# Altium footprint library MYLIB.PcbLib: 600 footprints (part 23 of 39)
Each footprint in its own frame and in the unit in brackets; x right, y up, seen from the top. Pads: shape width x height; smd on the part's side, far side on the other; paste and mask are expansions set on the pad; w line width, h text height; cw(c..) or ccw(c..) is an arc to the next point about the centre after c.
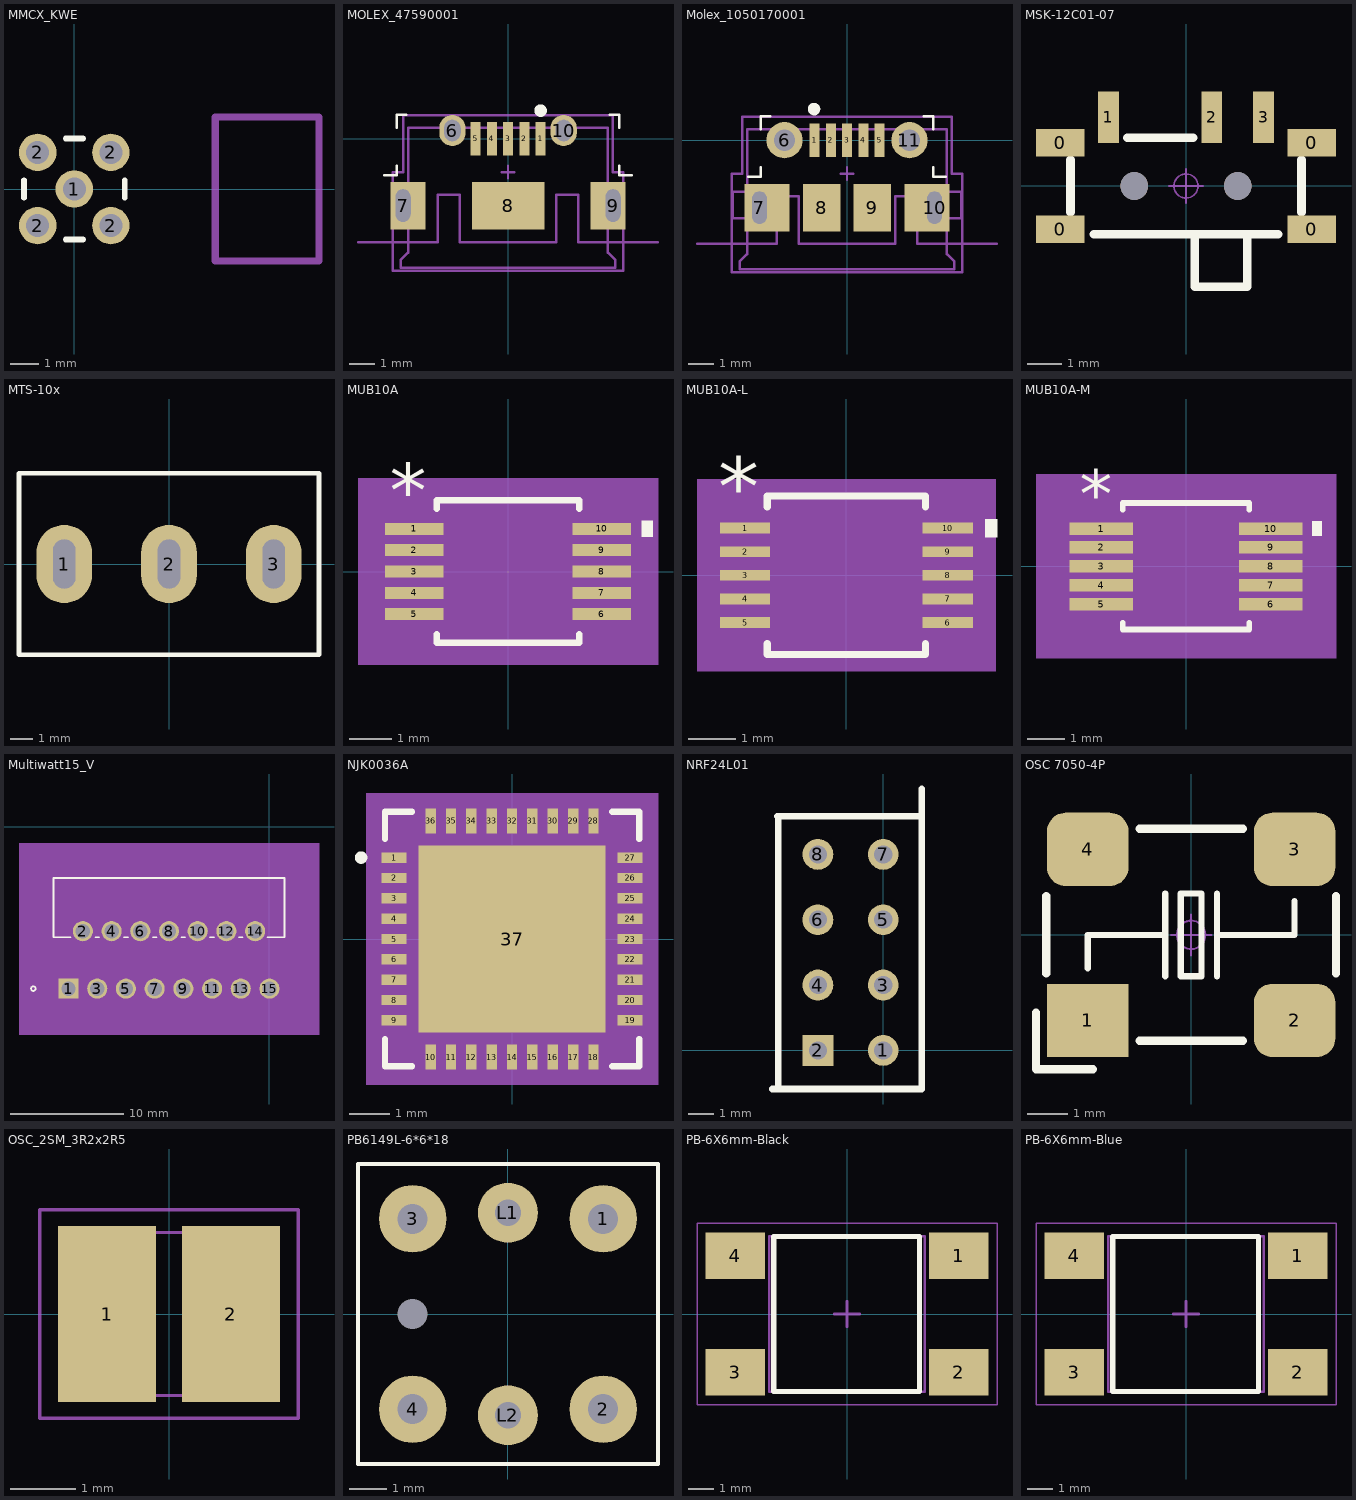
[diagram p22: the footprints below, top view; thin cyan lines are the x and y axes]

## MMCX_KWE [mm]
pads (5):
  round 1.3 hole 0.8: 1(0,0) 2(-1.27,-1.27) 2(-1.27,1.27) 2(1.27,-1.27) 2(1.27,1.27)
Top Overlay:
  lines w0.2: -1.75,-0.3 -1.75,0.3 ; -0.3,-1.75 0.3,-1.75 ; -0.3,1.75 0.3,1.75 ; 1.75,-0.3 1.75,0.3
Mechanical 13:
  lines w0.254: 4.9,-2.5 4.9,2.5 8.5,2.5 8.5,-2.5 4.9,-2.5
3D body: height 3.85, standoff 0, extent -1.75,-1.75 1.75,1.75
3D body: height 3.67, standoff 0.18, extent 1.75,-1.75 4.89,1.75
3D body: height 0, standoff -3, extent -1.52,1.02 -1.02,1.52
3D body: height 0, standoff -3, extent -0.25,-0.25 0.25,0.25
3D body: height 0, standoff -3, extent 1.02,1.02 1.52,1.52
3D body: height 0, standoff -3, extent -1.52,-1.52 -1.02,-1.02
3D body: height 0, standoff -3, extent 1.02,-1.52 1.52,-1.02

## MOLEX_47590001 [mm] "USB Micro-B Connector"
height 2.667
pads (10):
  rect 0.4x1.35 smd: 1(1.3,0) 2(0.65,0) 3(0,0) 4(-0.65,0) 5(-1.3,0)
  oval 1.05x1.25 hole 0.65 slot 0.85 at 90 deg: 6(-2.225,0.325) 10(2.225,0.325)
  rect 1.4x1.9 hole 0.6 slot 1.3 at 90 deg copper offset 0.2,0: 7(-4.2,-2.675)
  rect 2.9x1.9 smd: 8(0,-2.675)
  rect 1.4x1.9 hole 0.6 slot 1.3 at 90 deg copper offset -0.2,0: 9(4.2,-2.675)
Top Overlay:
  circle w0.25: c1.304,1.122 r0.125
  lines w0.1: -4.953,-1.465 -4.445,-1.465 -4.445,-1.084 ; -4.445,0.44 -4.445,0.948 -4.064,0.948 ; 4.064,0.948 4.445,0.948 4.445,0.44 ; 4.445,-1.084 4.445,-1.465 4.953,-1.465
Mechanical 1:
  lines w0.1: -6,-4.137 -2.82,-4.137 -2.82,-2.238 -1.92,-2.238 -1.92,-4.137 0,-4.137 1.92,-4.137 1.92,-2.238 2.82,-2.238 2.82,-4.137 6,-4.137
  text "Board edge" at 5.588,-4.005 h0.2
Mechanical 13:
  lines w0.1: -4,0.442 -4,-2.058 -4.572,-2.058 -4.572,-3.116 -4,-3.116 -4,-4.558 -4.3,-4.858 -4.3,-5.158 4.3,-5.158 4.3,-4.858 4,-4.558 4,-3.116 4.572,-3.116 4.572,-2.058 4,-2.058 4,0.442 ; -4,0.442 4,0.442 ; -4,0.442 4,0.442
Mechanical 15:
  lines w0.1: -4.2,0.937 4.2,0.937 ; -4.2,0.94 -4.2,-1.338 -4.6,-1.338 -4.6,-4.137 -4.6,-5.275 4.6,-5.275 4.6,-4.137 4.6,-1.338 4.2,-1.338 4.2,0.94 ; -0.254,-1.338 0.254,-1.338 ; 0,-1.592 0,-1.084
3D body "ZX62R-B-5P.stp": height 2.71, standoff -0.23, extent -4.4,-5.291 4.4,0.44

## Molex_1050170001 [mm] "USB Micro-B Connector"
height 2.667
pads (11):
  rect 0.4x1.35 smd: 1(-1.3,0) 2(-0.65,0) 3(0,0) 4(0.65,0) 5(1.3,0)
  round 1.45 hole 0.85: 6(-2.5,0) 11(2.5,0)
  rect 1.8x1.9 hole 0.6 slot 1.3 at 90 deg copper offset 0.3,0: 7(-3.5,-2.7)
  rect 1.5x1.9 smd: 8(-1,-2.7) 9(1,-2.7)
  rect 1.8x1.9 hole 0.6 slot 1.3 at 90 deg copper offset -0.3,0: 10(3.5,-2.7)
Top Overlay:
  circle w0.25: c-1.319,1.245 r0.125
  lines w0.1: -3.953,-1.465 -3.445,-1.465 -3.445,-1.084 ; -3.445,0.44 -3.445,0.948 -3.064,0.948 ; 3.064,0.948 3.445,0.948 3.445,0.44 ; 3.445,-1.084 3.445,-1.465 3.953,-1.465
Mechanical 1:
  lines w0.1: -6,-4.137 -2.82,-4.137 -2.82,-2.238 -1.92,-2.238 -1.92,-4.137 0,-4.137 1.92,-4.137 1.92,-2.238 2.82,-2.238 2.82,-4.137 6,-4.137
  text "Board edge" at 5.588,-4.005 h0.2
Mechanical 13:
  lines w0.1: -4,0.442 -4,-2.058 -4.572,-2.058 -4.572,-3.116 -4,-3.116 -4,-4.558 -4.3,-4.858 -4.3,-5.158 4.3,-5.158 4.3,-4.858 4,-4.558 4,-3.116 4.572,-3.116 4.572,-2.058 4,-2.058 4,0.442 ; -4,0.442 4,0.442 ; -4,0.442 4,0.442
Mechanical 15:
  lines w0.1: -4.2,0.937 4.2,0.937 ; -4.2,0.94 -4.2,-1.338 -4.6,-1.338 -4.6,-4.137 -4.6,-5.275 4.6,-5.275 4.6,-4.137 4.6,-1.338 4.2,-1.338 4.2,0.94 ; -0.254,-1.338 0.254,-1.338 ; 0,-1.592 0,-1.084
3D body "1050170001.stp": height 2.58, standoff -0.72, extent -4.1,-5.207 4.1,0.193

## MSK-12C01-07 [mm] "6.7*2.8*1.5mm(长宽高）"
pads (9):
  rect 1.4x0.8 smd: 0(-3.65,-1.25) 0(-3.65,1.25) 0(3.65,-1.25) 0(3.65,1.25)
  rect 0.6x1.5 smd: 1(-2.25,1.996) 2(0.75,1.996) 3(2.25,1.996)
  round 0.8 hole 0.8: " "(-1.5,0) " "(1.5,0)
Top Overlay:
  lines w0.254: -3.35,-0.762 -3.35,0.762 ; -2.667,-1.397 2.667,-1.397 ; -1.699,1.397 0.206,1.397 ; 0.254,-1.4 0.254,-2.921 1.778,-2.921 1.778,-1.4 ; 3.35,-0.762 3.35,0.762
Mechanical 15:
  circle w0.05: c0,0 r0.35
  lines w0.05: -0.5,0 0.5,0 ; 0,-0.5 0,0.5
3D body "MSK-12C01-07.STEP": height 1.5, standoff -0.5, extent -3.92,-2.9 3.92,2.4

## MTS-10x [mm] "MTS10系列3脚扭子开关"
pads (3):
  oval 2.5x3.5 hole 1 slot 2.2 at 90 deg unplated: 1(-4.7,0) 2(0,0) 3(4.7,0)
Top Overlay:
  lines w0.203: -6.731,-4.064 -6.731,4.064 6.731,4.064 6.731,-4.064 -6.731,-4.064
3D body "MTS-102.STEP": height 30.47, standoff -2.95, extent -6.6,-3.95 6.6,3.95

## MUB10A [mil]
pads (10):
  rect 54x11 smd: 1(-86.5,39.37) 2(-86.5,19.68) 3(-86.5,0) 4(-86.5,-19.68) 5(-86.5,-39.37) 6(86.5,-39.37) 7(86.5,-19.68) 8(86.5,0) 9(86.5,19.68) 10(86.5,39.37)
Top Overlay:
  region: 123.5,46.87 133.5,46.87 133.5,31.87 123.5,31.87
  lines w6: -66,-57.97 -66,-66 66,-66 66,-57.97 ; -66,57.97 -66,66 66,66 66,57.97
  text "*" at -109,49.87 h50
Mechanical 5:
  region: 138.5,-86 -138.5,-86 -138.5,86 138.5,86
Mechanical 13:
  lines w0: -12,61 ccw(c0,61) 12,61
  lines w1: -99.5,-45.87 -99.5,-32.87 -61,-32.87 -61,-45.87 -99.5,-45.87 ; -99.5,-26.18 -99.5,-13.19 -61,-13.19 -61,-26.18 -99.5,-26.18 ; -99.5,-6.5 -99.5,6.5 -61,6.5 -61,-6.5 -99.5,-6.5 ; -99.5,13.19 -99.5,26.18 -61,26.18 -61,13.19 -99.5,13.19 ; -99.5,32.87 -99.5,45.87 -61,45.87 -61,32.87 -99.5,32.87 ; -61,-61 61,-61 61,61 -61,61 -61,-61 ; 61,-45.87 61,-32.87 99.5,-32.87 99.5,-45.87 61,-45.87 ; 61,-26.18 61,-13.19 99.5,-13.19 99.5,-26.18 61,-26.18 ; 61,-6.5 61,6.5 99.5,6.5 99.5,-6.5 61,-6.5 ; 61,13.19 61,26.18 99.5,26.18 99.5,13.19 61,13.19 ; 61,32.87 61,45.87 99.5,45.87 99.5,32.87 61,32.87
  text "*" at -63.5,24.87 h50
Mechanical 15:
  region: -71,-51.21 -123.5,-51.21 -123.5,51.21 -71,51.21 -71,71 71,71 71,51.21 123.5,51.21 123.5,-51.21 71,-51.21 71,-71 -71,-71
  lines w6: -123.5,-51.21 -123.5,51.21 -71,51.21 -71,71 71,71 71,51.21 123.5,51.21 123.5,-51.21 71,-51.21 71,-71 -71,-71 -71,-51.21 -123.5,-51.21
3D body: height 10, standoff 0, extent 0,0 10,10

## MUB10A-L [mil]
pads (10):
  rect 42x9 smd: 1(-84.5,39.37) 2(-84.5,19.68) 3(-84.5,0) 4(-84.5,-19.68) 5(-84.5,-39.37) 6(84.5,-39.37) 7(84.5,-19.68) 8(84.5,0) 9(84.5,19.68) 10(84.5,39.37)
Top Overlay:
  region: 115.5,46.87 125.5,46.87 125.5,31.87 115.5,31.87
  lines w6: -66,-56.97 -66,-66 66,-66 66,-56.97 ; -66,56.97 -66,66 66,66 66,56.97
  text "*" at -107,48.87 h50
Mechanical 5:
  region: 124.5,-80 -124.5,-80 -124.5,80 124.5,80
Mechanical 13:
  lines w0: -12,61 ccw(c0,61) 12,61
  lines w1: -99.5,-45.87 -61,-45.87 -61,-32.87 -99.5,-32.87 -99.5,-45.87 ; -99.5,-26.18 -61,-26.18 -61,-13.19 -99.5,-13.19 -99.5,-26.18 ; -99.5,-6.5 -61,-6.5 -61,6.5 -99.5,6.5 -99.5,-6.5 ; -99.5,13.19 -61,13.19 -61,26.18 -99.5,26.18 -99.5,13.19 ; -99.5,32.87 -61,32.87 -61,45.87 -99.5,45.87 -99.5,32.87 ; -61,-61 -61,61 61,61 61,-61 -61,-61 ; 61,-45.87 99.5,-45.87 99.5,-32.87 61,-32.87 61,-45.87 ; 61,-26.18 99.5,-26.18 99.5,-13.19 61,-13.19 61,-26.18 ; 61,-6.5 99.5,-6.5 99.5,6.5 61,6.5 61,-6.5 ; 61,13.19 99.5,13.19 99.5,26.18 61,26.18 61,13.19 ; 61,32.87 99.5,32.87 99.5,45.87 61,45.87 61,32.87
  text "*" at -63.5,23.87 h50
Mechanical 15:
  region: -65,-50.01 -109.5,-50.01 -109.5,50.01 -65,50.01 -65,65 65,65 65,50.01 109.5,50.01 109.5,-50.01 65,-50.01 65,-65 -65,-65
  lines w6: -109.5,-50.01 -65,-50.01 -65,-65 65,-65 65,-50.01 109.5,-50.01 109.5,50.01 65,50.01 65,65 -65,65 -65,50.01 -109.5,50.01 -109.5,-50.01
3D body: height 10, standoff 0, extent 0,0 10,10

## MUB10A-M [mil]
pads (10):
  rect 66x13 smd: 1(-88.5,39.37) 2(-88.5,19.68) 3(-88.5,0) 4(-88.5,-19.68) 5(-88.5,-39.37) 6(88.5,-39.37) 7(88.5,-19.68) 8(88.5,0) 9(88.5,19.68) 10(88.5,39.37)
Top Overlay:
  region: 131.5,46.87 141.5,46.87 141.5,31.87 131.5,31.87
  lines w6: -66,-58.97 -66,-66 66,-66 66,-58.97 ; -66,58.97 -66,66 66,66 66,58.97
  text "*" at -111,50.87 h50
Mechanical 5:
  region: 156.5,-96 -156.5,-96 -156.5,96 156.5,96
Mechanical 13:
  lines w0: -12,61 ccw(c0,61) 12,61
  lines w1: -99.5,-45.87 -99.5,-32.87 -61,-32.87 -61,-45.87 -99.5,-45.87 ; -99.5,-26.18 -99.5,-13.19 -61,-13.19 -61,-26.18 -99.5,-26.18 ; -99.5,-6.5 -99.5,6.5 -61,6.5 -61,-6.5 -99.5,-6.5 ; -99.5,13.19 -99.5,26.18 -61,26.18 -61,13.19 -99.5,13.19 ; -99.5,32.87 -99.5,45.87 -61,45.87 -61,32.87 -99.5,32.87 ; -61,-61 61,-61 61,61 -61,61 -61,-61 ; 61,-45.87 61,-32.87 99.5,-32.87 99.5,-45.87 61,-45.87 ; 61,-26.18 61,-13.19 99.5,-13.19 99.5,-26.18 61,-26.18 ; 61,-6.5 61,6.5 99.5,6.5 99.5,-6.5 61,-6.5 ; 61,13.19 61,26.18 99.5,26.18 99.5,13.19 61,13.19 ; 61,32.87 61,45.87 99.5,45.87 99.5,32.87 61,32.87
  text "*" at -63.5,25.87 h50
Mechanical 15:
  region: -81,-53.21 -141.5,-53.21 -141.5,53.21 -81,53.21 -81,81 81,81 81,53.21 141.5,53.21 141.5,-53.21 81,-53.21 81,-81 -81,-81
  lines w6: -141.5,-53.21 -141.5,53.21 -81,53.21 -81,81 81,81 81,53.21 141.5,53.21 141.5,-53.21 81,-53.21 81,-81 -81,-81 -81,-53.21 -141.5,-53.21
3D body: height 10, standoff 0, extent 0,0 10,10

## Multiwatt15_V [mil]
pads (15):
  rect 70x70 hole 50: 1(-700,-564.42)
  round 70 hole 50: 2(-650,-364.42) 3(-600,-564.42) 4(-550,-364.42) 5(-500,-564.42) 6(-450,-364.42) 7(-400,-564.42) 8(-350,-364.42) 9(-300,-564.42) 10(-250,-364.42) 11(-200,-564.42) 12(-150,-364.42) 13(-100,-564.42) 14(-50,-364.42) 15(0,-564.42)
Top Overlay:
  circle w6: c-822.5,-564.42 r8
  lines w6: -693.13,-385.71 -752.5,-385.71 -752.5,-178.71 52.5,-178.71 52.5,-385.71 -6.87,-385.71 ; -606.87,-385.71 -593.13,-385.71 ; -506.87,-385.71 -493.13,-385.71 ; -406.87,-385.71 -393.13,-385.71 ; -306.87,-385.71 -293.13,-385.71 ; -206.87,-385.71 -193.13,-385.71 ; -106.87,-385.71 -93.13,-385.71
Mechanical 5:
  region: -872.5,-58.71 172.5,-58.71 172.5,-724.42 -872.5,-724.42
Mechanical 13:
  circle w0: c-737.5,-370.71 r8
  lines w1: -747.5,-380.71 -747.5,-183.71 47.5,-183.71 47.5,-380.71 -747.5,-380.71
Mechanical 15:
  region: 57.5,-173.71 -757.5,-173.71 -757.5,-609.42 57.5,-609.42
  lines w6: -757.5,-609.42 57.5,-609.42 57.5,-173.71 -757.5,-173.71 -757.5,-609.42
3D body: height 10, standoff 0, extent 0,0 10,10

## NJK0036A [mil]
pads (37):
  rect 24x10 smd paste+0 mask+0: 1(-114.17,78.74) 2(-114.17,59.06) 3(-114.17,39.37) 4(-114.17,19.68) 5(-114.17,0) 6(-114.17,-19.68) 7(-114.17,-39.37) 8(-114.17,-59.06) 9(-114.17,-78.74) 19(114.17,-78.74) 20(114.17,-59.06) 21(114.17,-39.37) 22(114.17,-19.68) 23(114.17,0) 24(114.17,19.68) 25(114.17,39.37) 26(114.17,59.06) 27(114.17,78.74)
  rect 10x24 smd paste+0 mask+0: 10(-78.74,-114.17) 11(-59.06,-114.17) 12(-39.37,-114.17) 13(-19.68,-114.17) 14(0,-114.17) 15(19.68,-114.17) 16(39.37,-114.17) 17(59.06,-114.17) 18(78.74,-114.17) 28(78.74,114.17) 29(59.06,114.17) 30(39.37,114.17) 31(19.68,114.17) 32(0,114.17) 33(-19.68,114.17) 34(-39.37,114.17) 35(-59.06,114.17) 36(-78.74,114.17)
  rect 181x181 smd paste-90 mask+0: 37(0,0)
Top Overlay:
  circle w6: c-146.02,78.74 r3
  lines w6: -123,-96.84 -123,-123 -96.84,-123 ; -123,96.84 -123,123 -96.84,123 ; 96.84,-123 123,-123 123,-96.84 ; 96.84,123 123,123 123,96.84
Top Paste:
  region: 86.56,-34.1 34.1,-34.1 34.1,-86.56 86.56,-86.56
  region: 86.56,26.23 34.1,26.23 34.1,-26.23 86.56,-26.23
  region: 86.56,86.56 34.1,86.56 34.1,34.1 86.56,34.1
  region: 26.23,-34.1 -26.23,-34.1 -26.23,-86.56 26.23,-86.56
  region: 26.23,26.23 -26.23,26.23 -26.23,-26.23 26.23,-26.23
  region: 26.23,86.56 -26.23,86.56 -26.23,34.1 26.23,34.1
  region: -34.1,-34.1 -86.56,-34.1 -86.56,-86.56 -34.1,-86.56
  region: -34.1,26.23 -86.56,26.23 -86.56,-26.23 -34.1,-26.23
  region: -34.1,86.56 -86.56,86.56 -86.56,34.1 -34.1,34.1
Mechanical 5:
  region: -141.17,141.17 141.17,141.17 141.17,-141.17 -141.17,-141.17
Mechanical 13:
  circle w0: c-112.17,78.74 r3
  lines w1: -118,68 -68,118 ; -118,-118 -118,118 118,118 118,-118 -118,-118
Mechanical 15:
  region: -93.74,-128 -128,-128 -128,-93.74 -136.17,-93.74 -136.17,93.74 -128,93.74 -128,128 -93.74,128 -93.74,136.17 93.74,136.17 93.74,128 128,128 128,93.74 136.17,98.74 136.17,-93.74 128,-93.74 128,-128 93.74,-128 93.74,-136.17 -93.74,-136.17
  lines w6: -136.17,-93.74 -136.17,93.74 -128,93.74 -128,128 -93.74,128 -93.74,136.17 93.74,136.17 93.74,128 128,128 128,93.74 136.17,93.74 136.17,-93.74 128,-93.74 128,-128 93.74,-128 93.74,-136.17 -93.74,-136.17 -93.74,-128 -128,-128 -128,-93.74 -136.17,-93.74
3D body: height 10, standoff 0, extent 0,0 10,10

## NRF24L01 [mm]
pads (8):
  round 1.2 hole 0.7: 1(0,0) 3(0,2.54) 4(-2.54,2.54) 5(0,5.08) 6(-2.54,5.08) 7(0,7.62) 8(-2.54,7.62)
  rect 1.2x1.2 hole 0.7: 2(-2.54,0)
Top Overlay:
  lines w0.254: -4.318,-1.5 1.5,-1.5 1.5,10.16 ; -4.089,-1.5 -4.089,9.068 -4.115,9.093 1.5,9.093

## OSC 7050-4P [mm] "7mm*5mm*1.3mm(长*宽*高)"
pads (4):
  rect 2x1.8 smd: 1(-2.54,-2.1)
  rrect50% 2x1.8 smd: 2(2.54,-2.1) 3(2.54,2.1) 4(-2.54,2.1)
Top Overlay:
  lines w0.152: -2.54,-0.821 -2.54,0 -1.397,0 -0.635,0 ; -0.635,-1.016 -0.635,1.016 ; 0.635,-1.016 0.635,1.016 ; 0.635,0 1.397,0 2.54,0 2.54,0.83 ; -0.254,-1.016 0.254,-1.016 0.254,1.016 -0.254,1.016 -0.254,-1.016
  lines w0.203: -3.81,-1.905 -3.81,-3.302 -2.413,-3.302 ; -3.556,-0.948 -3.556,0.957 ; -1.27,-2.599 1.27,-2.599 ; -1.27,2.608 1.27,2.608 ; 3.556,-0.948 3.556,0.957
Mechanical 15:
  circle w0.05: c0,0 r0.35
  lines w0.05: -0.5,0 0.5,0 ; 0,-0.5 0,0.5
3D body "OSC 7050-4.STEP": height 1.36, standoff 0.03, extent -3.5,-2.5 3.5,2.5

## OSC_2SM_3R2x2R5 [mm] "Crystal 8M Hz 3.2x2.5mm SMD"
pads (2):
  rect 1.5x2.7 smd: 1(-0.95,0) 2(0.95,0)
Mechanical 13:
  lines w0.051: -1.6,-1.25 1.6,-1.25 1.6,1.25 -1.6,1.25 -1.6,-1.25
Mechanical 15:
  lines w0.051: -1.981,-1.6 -1.981,1.6 1.981,1.6 1.981,-1.6 -1.981,-1.6
3D body: height 1, standoff 0, extent -1.6,-1.25 1.6,1.25

## PB6149L-6*6*18 [mm] "6mm*6mm*18mm(长*宽*高)"
pads (7):
  round 1.8 hole 0.8: 1(2.54,2.54) 2(2.54,-2.54) 3(-2.54,2.54) 4(-2.54,-2.54)
  round 0 hole 0.8: 7(-2.54,0)
  round 1.6 hole 0.7: L1(0,2.7) L2(0,-2.7)
Top Overlay:
  lines w0.1: -4,-4 4,-4 4,4 -4,4 -4,-4
3D body "PB6149L-6X6X18.STEP": height 18.05, standoff -3.45, extent -4,-4 4,4

## PB-6X6mm-Black [mm] "Surface Mounting Type Tact Switch, 4-Leads, Body 6x6mm, Height 4.5mm Black"
height 4.5
pads (4):
  rect 2.3x1.8 smd: 1(4.325,2.25) 2(4.325,-2.25) 3(-4.325,-2.25) 4(-4.325,2.25)
Top Overlay:
  lines w0.2: -2.831,-3 -2.831,3 2.808,3 2.808,-3 -2.831,-3
Mechanical 13:
  lines w0.1: -3,-3 3,-3 3,3 -3,3 -3,-3
Mechanical 15:
  lines w0.05: -5.8,-3.5 5.8,-3.5 5.8,3.5 -5.8,3.5 -5.8,-3.5
  lines w0.1: -0.5,0 0.5,0 ; 0,-0.5 0,0.5
3D body: height 3.5, standoff 0, extent -3,-3 3,3
3D body: height 10.5, standoff 3.5, extent -1.736,-1.746 1.75,1.747
3D body: height 3.9, standoff 2.3, extent -2.951,1.363 -1.359,2.956
3D body: height 3.9, standoff 2.3, extent 1.363,1.359 2.956,2.95
3D body: height 3.9, standoff 2.3, extent -2.956,-2.951 -1.362,-1.359
3D body: height 3.9, standoff 2.3, extent 1.359,-2.956 2.95,-1.362

## PB-6X6mm-Blue [mm] "Surface Mounting Type Tact Switch, 4-Leads, Body 6x6mm, Height 4.5mm,Blue"
height 4.5
pads (4):
  rect 2.3x1.8 smd: 1(4.325,2.25) 2(4.325,-2.25) 3(-4.325,-2.25) 4(-4.325,2.25)
Top Overlay:
  lines w0.2: -2.831,-3 -2.831,3 2.808,3 2.808,-3 -2.831,-3
Mechanical 13:
  lines w0.1: -3,-3 3,-3 3,3 -3,3 -3,-3
Mechanical 15:
  lines w0.05: -5.8,-3.5 -5.8,3.5 5.8,3.5 5.8,-3.5 -5.8,-3.5
  lines w0.1: -0.5,0 0.5,0 ; 0,-0.5 0,0.5
3D body: height 3.5, standoff 0, extent -3,-3 3,3
3D body: height 10.5, standoff 3.5, extent -1.736,-1.746 1.75,1.747
3D body: height 3.9, standoff 2.3, extent -2.951,1.363 -1.359,2.956
3D body: height 3.9, standoff 2.3, extent 1.363,1.359 2.956,2.95
3D body: height 3.9, standoff 2.3, extent -2.956,-2.951 -1.362,-1.359
3D body: height 3.9, standoff 2.3, extent 1.359,-2.956 2.95,-1.362